# Altium footprint library MyLibrarySum.PcbLib: 208 footprints (part 2 of 13)
Each footprint in its own frame and in the unit in brackets; x right, y up, seen from the top. Pads: shape width x height; smd on the part's side, far side on the other; paste and mask are expansions set on the pad; w line width, h text height; cw(c..) or ccw(c..) is an arc to the next point about the centre after c.
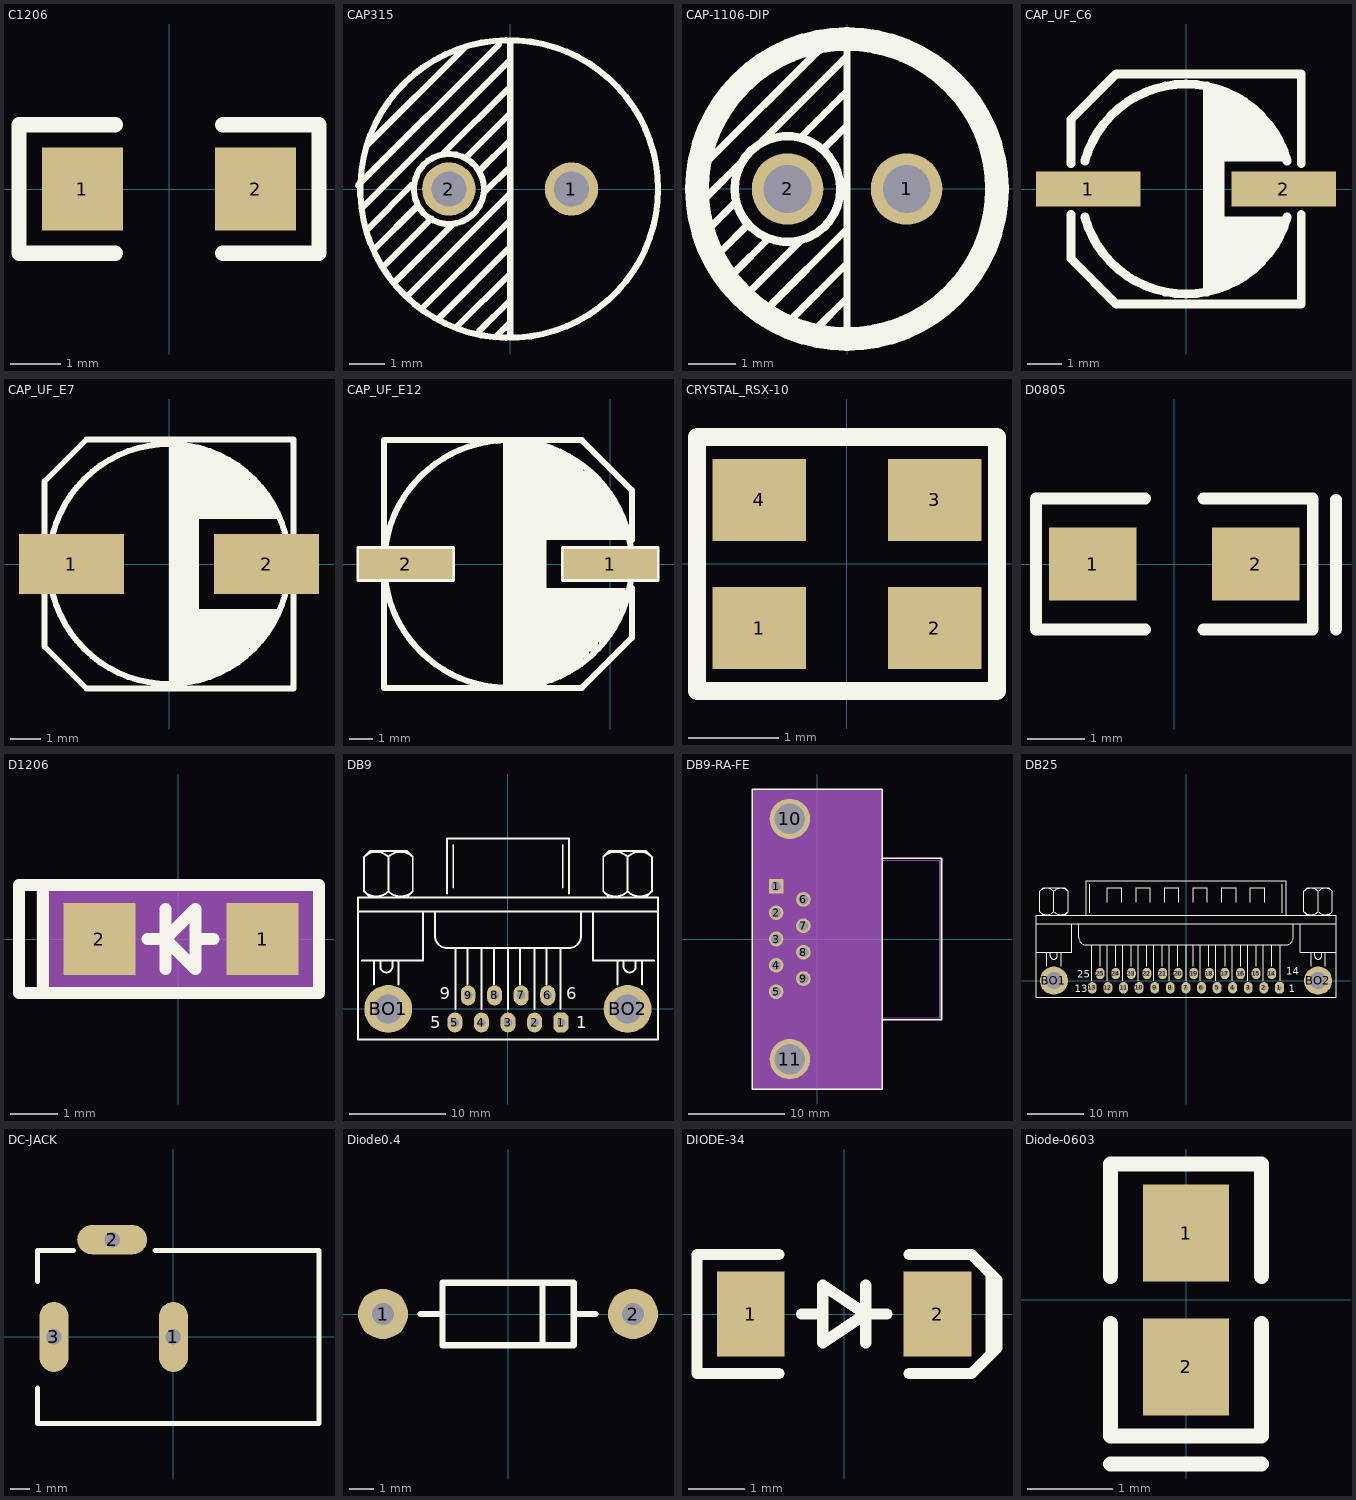
[diagram p1: the footprints below, top view; thin cyan lines are the x and y axes]

## C1206 [mm] "SMT电容"
height 1.5
pads (2):
  rect 1.6x1.65 smd: 1(-1.714,0) 2(1.714,0)
Top Overlay:
  lines w0.305: -1.067,-1.27 -2.972,-1.27 -2.972,1.27 -1.067,1.27 ; 1.067,-1.27 2.972,-1.27 2.972,1.27 1.067,1.27
3D body: height 1.6, standoff 0, extent -1.6,-0.762 1.6,0.758

## CAP315 [mil]
pads (2):
  round 60 hole 39.37: 1(68.9,0) 2(-68.9,0)
Top Overlay:
  circle w7: c-68.9,0 r39.37
  circle w7: c-1.18,0 r167.32
  lines w7: -171,4 -12.5,162.5 ; -165,-20 0,145 ; -160,-45 -109.87,5.13 ; -160,50 -50,160 ; -152,-67 -105.25,-20.25 ; -142,-87 -88.44,-33.44 ; -130,-105 -63.81,-38.81 ; -115,-120 0,-5 ; -100,-135 0,-35 ; -80,-145 0,-65 ; -75,40 0,115 ; -60,-155 0,-95 ; -50,35 0,85 ; -35,-160 0,-125 ; -35,20 0,55 ; -30,-5 0,25 ; -15,-165 0,-150 ; 0,-165 0,165

## CAP-1106-DIP [mm]
pads (2):
  round 1.5 hole 1 mask+0.051: 1(1.25,0) 2(-1.25,0)
Top Overlay:
  circle w0.5: c-0.001,0 r3.151
  circle w0.178: c-1.252,0 r1.109
  lines w0.152: -2.98,-0.196 -2.175,0.609 ; -2.958,0.556 -0.576,2.938 ; -2.863,-0.796 -2.323,-0.256 ; -2.649,-1.312 -2.076,-0.739 ; -2.368,-1.758 -1.651,-1.041 ; -2.031,-2.144 -0.966,-1.08 ; -1.906,0.884 -0.001,2.789 ; -1.657,-2.494 -0.003,-0.84 ; -1.162,-2.724 -0.003,-1.565 ; -0.99,1.071 -0.003,2.059 ; -0.69,-2.976 -0.003,-2.289 ; -0.515,0.823 -0.003,1.335 ; -0.003,-2.984 -0.003,3.031

## CAP_UF_C6 [mm] "CAP-SMD_BD6.3-L6.6-W6.6-FD"
pads (2):
  rect 3x1 smd: 1(-2.8,0) 2(2.8,0)
Top Overlay:
  region: 0.5,-3 0.5,2.9 1.1,2.8 1.6,2.6 1.9,2.3 2.2,2.1 2.5,1.8 2.7,1.4 2.9,0.8 1.1,0.8 1.1,-0.8 2.9,-0.8 2.8,-1 2.7,-1.4 2.4,-1.7 2.2,-2.1 1.8,-2.4 1,-2.8
  lines w0.254: -3.297,-0.732 -3.297,-1.999 -1.996,-3.299 3.302,-3.299 3.302,-0.732 ; -3.297,0.732 -3.297,1.999 -1.996,3.299 3.302,3.299 3.302,0.732 ; -2.9,-0.8 ccw(c0,0) 2.9,-0.8 ; -2.9,0.8 cw(c0,0) 2.9,0.8

## CAP_UF_E7 [mm] "L-8.3/W-8.3/L-6.9"
pads (2):
  rect 3.5x2 smd: 1(-3.25,0) 2(3.25,0)
Top Overlay:
  circle w0.2: c0,0 r4
  rectangle: 0.8,3.65 1.25,3.9
  rectangle: 0.8,3.65 1.25,3.725
  rectangle: 2.55,2.55 2.9,2.775
  rectangle: 2.675,2.8 2.8,2.925
  rectangle: 1.25,3.65 1.45,3.725
  rectangle: 0.8,3.575 1.625,3.65
  rectangle: 0.8,3.425 1.875,3.575
  rectangle: 2,3.3 2.15,3.375
  rectangle: 2,3.15 2.35,3.3
  rectangle: 0.8,3.15 2,3.425
  rectangle: 0.8,3 2.5,3.15
  rectangle: 0.8,2.8 2.675,3
  rectangle: 0.8,2.7 2.8,2.8
  rectangle: 0.8,2.5 3,2.7
  rectangle: 0.7,2.3 3.2,2.5
  rectangle: 0.7,2.1 3.3,2.3
  rectangle: 0.6,1.9 3.4,2.1
  rectangle: 0.6,1.7 3.6,1.9
  rectangle: 0.6,1.5 3.6,1.7
  rectangle: 0.5,3.8 0.95,3.925
  rectangle: 0,-3.8 1,3.775
  rectangle: 0,3.775 0.775,3.925
  rectangle: 0.775,3.625 1,3.925
  rectangle: 0,-3.975 0.5,-3.8
  rectangle: 0.5,-3.925 0.95,-3.8
  rectangle: 0.6,-1.7 3.6,-1.5
  rectangle: 0.6,-1.9 3.6,-1.7
  rectangle: 0.6,-2.1 3.4,-1.9
  rectangle: 0.7,-2.3 3.3,-2.1
  rectangle: 0.7,-2.5 3.2,-2.3
  rectangle: 0.8,-2.7 3,-2.5
  rectangle: 0.8,-2.8 2.8,-2.7
  rectangle: 0.8,-3 2.675,-2.8
  rectangle: 0.8,-3.15 2.5,-3
  rectangle: 0.8,-3.425 2,-3.15
  rectangle: 2,-3.3 2.35,-3.15
  rectangle: 2,-3.375 2.15,-3.3
  rectangle: 0.8,-3.575 1.875,-3.425
  rectangle: 0.8,-3.65 1.625,-3.575
  rectangle: 1.25,-3.725 1.45,-3.65
  rectangle: 2.675,-2.925 2.8,-2.8
  rectangle: 2.55,-2.775 2.9,-2.55
  rectangle: 0.8,-3.725 1.25,-3.65
  rectangle: 0.8,-3.9 1.25,-3.65
  lines w0.2: -4.15,-2.75 -2.75,-4.15 ; -4.15,-2.743 -4.15,2.75 -2.75,4.15 4.15,4.15 4.15,-4.15 -2.743,-4.15
3D body: height 10.5, standoff 0, extent -4.852,-4.25 4.848,4.25

## CAP_UF_E12 [mil] "L-8.3/W-8.3/H-11.9"
pads (2):
  rect 155x50 smd: 1(0,0) 2(-338,0)
Top Overlay:
  circle w10: c-168.9,0.05 r204.7
  rectangle: -45,-145 -35,-140
  rectangle: -80,-175 -60,-165
  rectangle: -35,-145 -20,-130
  rectangle: -70,-170 -45,-155
  rectangle: -120,-190 -85,-155
  rectangle: -35,-130 -5,-115
  rectangle: 0,-110 10,-90
  rectangle: 0,-90 15,-75
  rectangle: 0,-75 25,-55
  rectangle: 0,-55 25,-40
  rectangle: -105,-180 -70,-155
  rectangle: -105,-155 -35,-115
  rectangle: -105,-115 0,-40
  rectangle: -95,180 -85,185
  rectangle: -100,180 -85,190
  rectangle: -95,175 -85,180
  rectangle: -65,165 -55,170
  rectangle: -110,180 -95,195
  rectangle: -110,160 -65,180
  rectangle: -5,100 5,105
  rectangle: -25,115 -10,135
  rectangle: 15,55 35.82,65
  rectangle: -5,100 5,105
  rectangle: -25,125 -15,135
  rectangle: -35,120 -20,145
  rectangle: -5,85 15,100
  rectangle: 0,60 20,85
  rectangle: -45,125 -30,155
  rectangle: -50,60 0,125
  rectangle: -105,40 35,60
  rectangle: -105,60 -45,165
  rectangle: -175,-204.72 -105,204.77
  lines w5: -175,-204.72 -175,204.77 ; -416.93,-27.51 -416.93,27.61 -259.45,27.61 -259.45,-27.51 -416.93,-27.51 ; -78.35,-27.51 -78.35,27.61 79.13,27.61 79.13,-27.51 -78.35,-27.51
  lines w10: -373.7,-204.72 -46.93,-204.72 35.74,-122.05 ; -373.62,-204.67 -373.62,204.77 -46.85,204.77 35.82,122.1 35.82,39.42 ; 35.82,-122 35.82,-39.32

## CRYSTAL_RSX-10 [mm]
pads (4):
  rect 1.03x0.9 smd: 1(-0.965,-0.705) 2(0.965,-0.705) 3(0.965,0.705) 4(-0.965,0.705)
Top Overlay:
  lines w0.2: -1.651,-1.397 -1.651,1.397 1.651,1.397 1.651,-1.397 -1.651,-1.397
3D body: height 0.7, standoff 0, extent -1.605,-1.272 1.605,1.238

## D0805 [mil]
pads (2):
  rect 60x50 smd: 1(-56,0) 2(56,0)
Top Overlay:
  lines w8: -20,-45 -95,-45 -95,45 -20,45 ; 20,-45 95,-45 95,45 20,45 ; 111,-45 111,44
3D body: height 29.53, standoff -29.53, extent -68.9,-29.06 68.9,30

## D1206 [mil] "D1206"
pads (2):
  rect 60x60 smd: 1(70.49,0) 2(-65.49,0)
Top Overlay:
  lines w10: -112.5,-45 -112.5,45 ; -25.49,0 -10.49,0 ; -10.49,-25 -10.49,25 ; 14.51,0 29.51,0 ; -10.49,0 14.51,25 14.51,-25 -10.49,0 ; -132.5,-45 2.5,-45 117.5,-45 117.5,45 2.5,45 -132.5,45 -132.5,-45
Mechanical 11:
  text "1" at 70.49,-10 h25
  text "2" at -65.49,-10 h25
Mechanical 12:
  lines w1: -117.5,-45 -117.5,45 117.5,45 117.5,-45 -117.5,-45
Mechanical 13:
  region: -117.5,-45 117.5,-45 117.5,45 -117.5,45
3D body: height 33.46, standoff 0, extent -70.94,-30 60.94,38.11

## DB9 [mil]
pads (11):
  oct 62x82 hole 35: 1(218.75,-55.83)
  oval 62x82 hole 35: 2(109.58,-55.83) 3(0.42,-55.83) 4(-108.75,-55.83) 5(-217.92,-55.83) 6(163.75,55.83) 7(54.58,55.83) 8(-54.58,55.83)
  oval 60x82 hole 35: 9(-163.75,55.83)
  round 196.67 hole 118.33: BO1(-492.08,0) BO2(492.08,0)
Top Overlay:
  lines w8: -616.25,400 617.08,400 ; -599.58,200 -349.58,200 -349.58,400 ; -591.34,483.25 ccw(c-541.25,533.33) -491.16,483.25 ; -591.34,625.09 cw(c-541.25,575) -491.16,625.09 ; -566.25,458.33 -591.25,483.33 -591.25,625 -566.25,650 -416.25,650 -391.25,625 -391.25,483.33 -416.25,458.33 ; -549.58,100 -549.58,200 ; -524.58,200 -524.58,175 ccw(c-499.58,175) -474.58,175 -474.58,200 ; -491.34,483.25 ccw(c-441.25,533.33) -391.16,483.25 ; -491.34,625.09 cw(c-441.25,575) -391.16,625.09 ; -491.25,483.33 -491.25,625 ; -449.58,100 -449.58,200 ; -299.58,400 -299.58,300 ccw(c-249.58,300) -249.58,250 250.42,250 ccw(c250.42,300) 300.42,300 300.42,400 ; -249.58,475 -249.58,700 250.42,700 250.42,475 ; -224.58,500 -224.58,675 ; -216.25,0 -216.25,250 ; -166.25,100 -166.25,250 ; -107.92,0 -107.92,250 ; -57.92,100 -57.92,250 ; 0.42,0 0.42,250 ; 50.42,100 50.42,250 ; 108.75,0 108.75,250 ; 158.75,100 158.75,250 ; 217.08,0 217.08,250 ; 225.42,500 225.42,675 ; 350.42,400 350.42,200 600.42,200 ; 392,483.25 ccw(c442.08,533.33) 492.17,483.25 ; 392,625.09 cw(c442.08,575) 492.17,625.09 ; 417.08,458.33 392.08,483.33 392.08,625 417.08,650 567.08,650 592.08,625 592.08,483.33 567.08,458.33 ; 450.42,100 450.42,200 ; 475.42,200 475.42,175 ccw(c500.42,175) 525.42,175 525.42,200 ; 492,483.25 ccw(c542.08,533.33) 592.17,483.25 ; 492,625.09 cw(c542.08,575) 592.17,625.09 ; 492.08,483.33 492.08,625 ; 550.42,100 550.42,200 ; -616.25,-125 617.08,-125 617.08,458.33 -616.25,458.33 -616.25,-125
  text "6" at 240.42,40 h50
  text "1" at 280.42,-80 h50
  text "5" at -319.58,-80 h50
  text "9" at -279.58,40 h50
3D body: height 494.09, standoff -137.8, extent -616.42,-140 616.42,600.16

## DB9-RA-FE [mm] "DSUB9-RA-FE"
pads (11):
  rect 1.524x1.524 hole 1.016: 1(-4.27,5.48)
  round 1.524 hole 1.016: 2(-4.27,2.74) 3(-4.27,0) 4(-4.27,-2.74) 5(-4.27,-5.48) 6(-1.43,4.11) 7(-1.43,1.37) 8(-1.43,-1.37) 9(-1.43,-4.11)
  round 4.2 hole 3.2: 10(-2.85,12.5) 11(-2.85,-12.5)
Top Overlay:
  lines w0.152: -6.75,-15.6 -6.75,15.6 6.75,15.6 6.75,-15.6 -6.75,-15.6
  lines w0.2: 6.75,-8.4 12.95,-8.4 12.95,8.4 6.75,8.4
Mechanical 11:
  text "1" at -4.27,5.2 h0.7
  text "10" at -2.85,11.38 h0.7
  text "11" at -2.85,-13.62 h0.7
  text "4" at -4.27,-3.02 h0.7
  text "6" at -1.43,3.83 h0.7
  text "9" at -1.43,-4.39 h0.7
  text "5" at -4.27,-5.76 h0.7
  text "3" at -4.27,-0.28 h0.7
  text "2" at -4.27,2.46 h0.7
  text "8" at -1.43,-1.65 h0.7
  text "7" at -1.43,1.09 h0.7
Mechanical 12:
  lines w0.025: 6.55,-8.2 12.74,-8.2 12.74,8.2 6.55,8.2 ; -6.53,-15.405 6.57,-15.405 6.57,15.405 -6.53,15.405 -6.53,-15.405
Mechanical 13:
  region: -6.75,-15.6 6.75,-15.6 6.75,15.6 -6.75,15.6
Mechanical 16:
  pour cut-out: -6.75,-15.6 6.75,-15.6 6.75,15.6 -6.75,15.6
3D body: height 6.25, standoff -10.05, extent -7.41,-15.786 11.79,15.024

## DB25 [mil]
pads (27):
  oct 62x80 hole 35: 1(654.17,-50)
  oval 62x80 hole 35: 2(545,-50) 3(435.83,-50) 4(326.67,-50) 5(217.5,-50) 6(108.33,-50) 7(-0.83,-50) 8(-110,-50) 9(-219.17,-50) 10(-328.33,-50) 11(-437.5,-50) 12(-546.67,-50) 13(-655.83,-50) 14(600,50) 15(490.83,50) 16(381.67,50) 17(272.5,50) 18(163.33,50) 19(54.17,50) 20(-55,50) 21(-164.17,50) 22(-273.33,50) 23(-382.5,50) 24(-491.67,50) 25(-600.83,50)
  round 196.67 hole 118.33: BO1(-925,0) BO2(925,0)
Top Overlay:
  lines w8: -1050,200 -800,200 -800,400 ; -1050,400 1050,400 ; -1025.09,483.25 ccw(c-975,533.33) -924.91,483.25 ; -1025.09,625.09 cw(c-975,575) -924.91,625.09 ; -1000,458.33 -1025,483.33 -1025,625 -1000,650 -850,650 -825,625 -825,483.33 -850,458.33 ; -975,100 -975,200 ; -950,200 -950,175 ccw(c-925,175) -900,175 -900,200 ; -925.09,483.25 ccw(c-875,533.33) -824.91,483.25 ; -925.09,625.09 cw(c-875,575) -824.91,625.09 ; -925,483.33 -925,625 ; -875,100 -875,200 ; -750,400 -750,300 ccw(c-700,300) -700,250 700,250 ccw(c700,300) 750,300 750,400 ; -700,458.33 -700,700 700,700 700,458.33 ; -675,475 -675,675 ; -658.33,0 -658.33,250 ; -600,100 -600,250 ; -550,0 -550,250 ; -550,550 -550,650 -450,650 -450,550 ; -491.67,100 -491.67,250 ; -441.67,0 -441.67,250 ; -383.33,100 -383.33,250 ; -350,550 -350,650 -250,650 -250,550 ; -333.33,0 -333.33,250 ; -275,100 -275,250 ; -225,0 -225,250 ; -166.67,100 -166.67,250 ; -150,550 -150,650 -50,650 -50,550 ; -116.67,0 -116.67,250 ; -58.33,100 -58.33,250 ; 0,0 0,250 ; 50,100 50,250 ; 50,550 50,650 150,650 150,550 ; 100,0 100,250 ; 158.33,100 158.33,250 ; 208.33,0 208.33,250 ; 250,550 250,650 350,650 350,550 ; 275,100 275,250 ; 325,0 325,250 ; 383.33,100 383.33,250 ; 433.33,0 433.33,250 ; 450,550 450,650 550,650 550,550 ; 491.67,100 491.67,250 ; 541.67,0 541.67,250 ; 600,100 600,250 ; 658.33,0 658.33,250 ; 675,475 675,675 ; 800,400 800,200 1050,200 ; 824.91,483.25 ccw(c875,533.33) 925.09,483.25 ; 824.91,625.09 cw(c875,575) 925.09,625.09 ; 850,458.33 825,483.33 825,625 850,650 1000,650 1025,625 1025,483.33 1000,458.33 ; 875,100 875,200 ; 900,200 900,175 ccw(c925,175) 950,175 950,200 ; 924.91,483.25 ccw(c975,533.33) 1025.09,483.25 ; 924.91,625.09 cw(c975,575) 1025.09,625.09 ; 925,483.33 925,625 ; 975,100 975,200 ; -1050,-116.67 -1050,458.33 1050,458.33 1050,-116.67 -1050,-116.67
  text "14" at 700,40 h50
  text "1" at 720,-80 h50
  text "13" at -780,-80 h50
  text "25" at -760,20 h50
3D body: height 200, standoff -311.81, extent -1065,-100 1055.08,524.41

## DC-JACK [mm]
pads (3):
  oval 1.5x3.6 hole 0.8: 1(0,0) 3(-6.147,0)
  oval 3.6x1.5 hole 0.8: 2(-3.15,5.004)
Top Overlay:
  lines w0.254: -6.985,-2.616 -6.985,-4.445 7.493,-4.445 7.493,4.445 -0.94,4.445 ; -6.985,2.845 -6.985,4.445 -5.131,4.445

## Diode0.4 [mil]
pads (2):
  round 80 hole 35: 1(-200,0) 2(200,0)
Top Overlay:
  lines w10: -140,0 -105,0 ; 55,-50 55,50 ; 105,0 140,0 ; -105,-50 105,-50 105,50 -105,50 -105,-10 -105,-50
3D body: height 131.89, standoff -78.74, extent -216.93,-56.3 216.93,50

## DIODE-34 [mm]
pads (2):
  rect 1.2x1.5 smd: 1(-1.65,0) 2(1.65,0)
Top Overlay:
  lines w0.2: -1.15,-1.05 -2.6,-1.05 -2.6,1.05 -1.15,1.05 ; -0.75,0 -0.381,0 ; 0.381,-0.508 0.381,0.508 ; 0.75,0 0.381,0 ; 1.15,-1.05 2.25,-1.05 2.6,-0.7 ; 1.15,1.05 2.25,1.05 2.6,0.7 ; 0.381,0 -0.381,-0.508 -0.381,0.508 0.381,0 ; 2.6,-0.7 2.6,0.675 2.6,0.7 ; 2.6,-0.7 2.7,-0.6 2.7,0.6 2.6,0.7
3D body: height 1.47, standoff -0.03, extent -1.75,-0.75 1.75,0.75

## Diode-0603 [mil]
height 31.5
pads (2):
  rect 40x45 smd: 1(0,31) 2(0,-31)
Top Overlay:
  lines w7: -35,-76 35,-76 ; -35,-11 -35,-63 35,-63 35,-11 ; -35,11 -35,63 35,63 35,11
3D body: height 31.5, standoff 0, extent -18.07,-31.54 18.15,31.46